# Altium footprint library iuh-thuc-hanh.PcbLib: 63 footprints (part 4 of 4)
Each footprint in its own frame and in the unit in brackets; x right, y up, seen from the top. Pads: shape width x height; smd on the part's side, far side on the other; paste and mask are expansions set on the pad; w line width, h text height; cw(c..) or ccw(c..) is an arc to the next point about the centre after c.
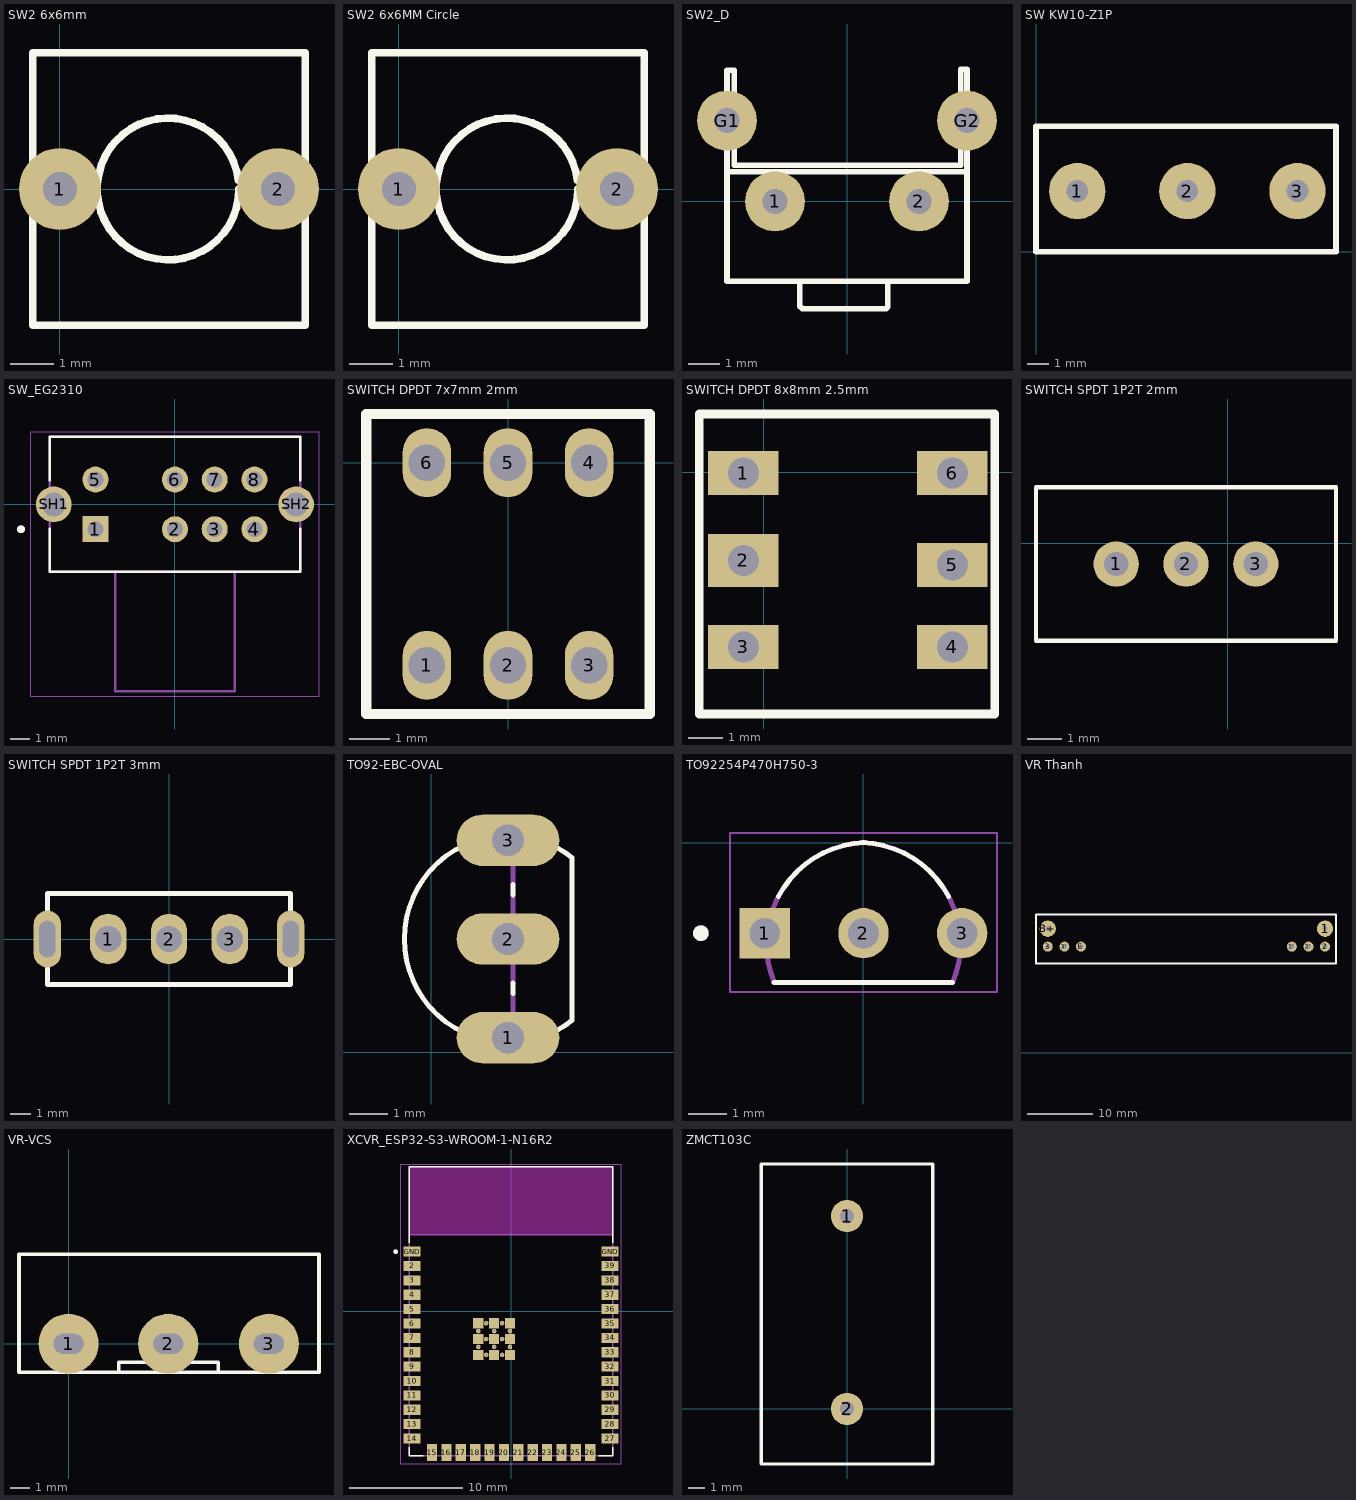
[diagram p3: the footprints below, top view; thin cyan lines are the x and y axes]

## SW2 6x6mm [mil] "SW button 2pin, 250x 250 mil"
height 100
pads (2):
  round 75 hole 31: 1(0,0) 2(200,0)
Top Overlay:
  lines w7: 163.64,8.26 ccw(c99.17,0) 164.17,0 ; -25,-125 -25,125 225,125 225,-125 -25,-125
3D body "82574 tact switch.stp": height 197, standoff -200, extent -22.73,-122.63 222.73,122.63

## SW2 6x6MM Circle [mil] "SW button 2pin, 250x 250 mil 6x6mm"
height 100
pads (2):
  round 75 hole 31: 1(0,0) 2(200,0)
Top Overlay:
  lines w7: 163.64,8.26 ccw(c99.17,0) 164.17,0 ; -25,-125 225,-125 225,125 -25,125 -25,-125
3D body "Push Button Switch 2-Pin.STEP": height 181.1, standoff -78.74, extent -52.32,-122.05 250.83,122.05

## SW2_D [mil] "SW button 2pin, 300x 300 x 250 mil"
height 100
pads (4):
  round 75 hole 31: 1(-90,0) 2(90,0) G1(-150,101) G2(150,101)
Top Overlay:
  lines w7: -150,37 150,37 ; -59,-100 -59,-131 -56,-134 49,-134 51,-132 51,-100 ; -150,-100 -150,164 -141,164 -141,45 142,45 142,165 150,165 150,-100 -150,-100

## SW KW10-Z1P [mm]
pads (3):
  round 2.6 hole 1: 1(1.905,2.794) 2(6.985,2.794) 3(12.065,2.794)
Top Overlay:
  lines w0.254: 0,0 0,5.779 13.843,5.779 13.843,0 0,0
3D body "Micro limit switch.STEP": height 11.31, standoff -1.55, extent 0.657,-0.202 14.605,7.948

## SW_EG2310 [mm]
height 4.7
pads (10):
  rect 1.308x1.308 / inner round 1.308 / far side rect 1.308x1.308 hole 0.8: 1(-4,-1.25)
  round 1.308 hole 0.8: 2(0,-1.25) 3(2,-1.25) 4(4,-1.25) 5(-4,1.25) 6(0,1.25) 7(2,1.25) 8(4,1.25)
  round 1.8 hole 1.2: SH1(-6.1,0) SH2(6.1,0)
Top Overlay:
  circle w0.2: c-7.75,-1.25 r0.1
  lines w0.127: -6.3,-1.22 -6.3,-3.4 6.3,-3.4 6.3,-1.22 ; -6.3,1.22 -6.3,3.4 6.3,3.4 6.3,1.22
Mechanical 13:
  circle w0.2: c-7.75,-1.25 r0.1
  lines w0.127: -3,-3.4 -6.3,-3.4 -6.3,3.4 6.3,3.4 6.3,-3.4 3,-3.4 ; -3,-3.4 3,-3.4 ; -3,-3.4 -3,-9.4 3,-9.4 3,-3.4
Mechanical 15:
  lines w0.05: -7.25,-9.65 -7.25,3.65 7.25,3.65 7.25,-9.65 -7.25,-9.65

## SWITCH DPDT 7x7mm 2mm [mm]
pads (6):
  oval 1.2x1.7 hole 0.9: 1(-2,-5) 2(0,-5) 3(2,-5) 4(2,0) 5(0,0) 6(-2,0)
Top Overlay:
  lines w0.254: -3.5,-6.2 -3.5,1.2 3.5,1.2 3.5,-6.2 -3.5,-6.2
3D body "LatchSwitch_7x7.SLDPRT": height 12.4, standoff -3.65, extent -3.5,-6.04 3.5,0.96

## SWITCH DPDT 8x8mm 2.5mm [mil]
pads (6):
  rect 80x50 hole 35: 1(-23,-1) 3(-23,-198) 4(214,-198) 5(214,-105) 6(214,-1)
  rect 80x60 hole 35: 2(-23,-100)
Top Overlay:
  lines w10: -73,-274 262,-274 262,66 -73,66 -73,-274
3D body "User Library-ZIPPY_P1-1S_8x8_Push_switch_lock.STEP": height 524.22, standoff -145.07, extent -62.48,-265.35 252.48,57.48

## SWITCH SPDT 1P2T 2mm [mm] "TE Connectivity SLS121PC04 SPDT slider"
height 10.058
pads (3):
  round 1.3 hole 0.7: 1(-3.2,-0.6) 2(-1.2,-0.6) 3(0.8,-0.6)
Top Overlay:
  lines w0.127: -5.5,-2.8 -5.5,1.6 3.1,1.6 3.1,-2.8 -5.5,-2.8
3D body "Selector Switch - SS12D00.stp": height 7.05, standoff -2.45, extent -5.563,-2.539 3.023,1.169

## SWITCH SPDT 1P2T 3mm [mm]
pads (5):
  oval 1.8x2.5 hole 1.3: 1(-3,0) 2(0,0) 3(3,0)
  oval 1.35x2.8 hole 0.8 slot 1.8 at 90 deg: ""(-6,0) ""(6,0)
Top Overlay:
  lines w0.254: -6,-2.25 -6,2.25 6,2.25 6,-2.25 -6,-2.25
3D body "Slide Switch SLS121PC04.STEP": height 10.01, standoff -4.32, extent -5.499,-2.794 5.499,2.794

## TO92-EBC-OVAL [mil]
pads (3):
  oval 104x52 hole 32: 1(78,15) 2(78,115) 3(78,215)
Top Overlay:
  lines w5: 33.63,19.84 cw(c78,115) 33.63,210.16 ; 83,59.72 83,70.28 ; 83,159.72 83,170.28 ; 122.37,19.82 ccw(c78,114.98) 142.64,32.24 ; 122.37,210.18 cw(c78,115.02) 142.64,197.76 ; 143,32.52 143,197.48
Mechanical 13:
  lines w5: 33.63,19.84 ccw(c78,115) 122.37,19.84 ; 33.63,210.16 cw(c78,115) 122.37,210.16 ; 83,10.12 83,59.72 ; 83,70.28 83,159.72 ; 83,170.28 83,219.88
3D body "step_temp.STEP": height 210, standoff -750, extent -90.97,-3.97 137.75,224.75

## TO92254P470H750-3 [mm]
height 7.5
pads (3):
  rect 1.298x1.298 / inner round 1.298 / far side rect 1.298x1.298 hole 0.79: 1(-2.54,-2.33)
  round 1.298 hole 0.79: 2(0,-2.33) 3(2.54,-2.33)
Top Overlay:
  circle w0.2: c-4.189,-2.33 r0.1
  lines w0.127: -2.3,-3.6 2.3,-3.6 ; -2.19,-1.381 cw(c0.112,-2.605) 0.021,0.001 ; -0.021,0.001 cw(c-0.112,-2.605) 2.19,-1.381
Mechanical 13:
  circle w0.2: c-4.189,-2.33 r0.1
  lines w0.127: -2.307,-3.582 cw(c0.11,-2.605) 0.019,0.001 ; -2.3,-3.6 2.3,-3.6 ; -0.019,0.001 cw(c-0.11,-2.605) 2.307,-3.582
Mechanical 15:
  lines w0.05: -3.439,-3.85 -3.439,0.252 3.439,0.252 3.439,-3.85 -3.439,-3.85
3D body "step_temp.STEP": height 8.09, standoff -9.01, extent -2.686,-3.81 2.794,-0.21

## VR Thanh [mil]
pads (8):
  round 98.43 hole 30: 1(1880,748.27) B+(210,748.27)
  round 60 hole 30: 1'(1680,640) 2(1880,640) 2'(1780,640) 3(210,640) 3'(310,640) E(410,640)
Top Overlay:
  lines w10: 139,538 1852,538 1946,538 1946,834 139,834 139,538

## VR-VCS [mil] "Volumn control single"
pads (3):
  round 120 hole 40 slot 60 at 0 deg: 1(0,0) 2(199,0) 3(400,0)
Top Overlay:
  lines w7: 100,-57 100,-37 299,-37 299,-57 ; -99,-57 500,-57 500,179 -99,179 -99,-57
3D body "SW3dPS-Pot.STEP": height 839.35, standoff -130, extent -110,-818.11 510,188.11

## XCVR_ESP32-S3-WROOM-1-N16R2 [mm]
height 3.25
pads (61):
  rect 1.5x0.9 smd: 2(-8.75,3.99) 3(-8.75,2.72) 4(-8.75,1.45) 5(-8.75,0.18) 6(-8.75,-1.09) 7(-8.75,-2.36) 8(-8.75,-3.63) 9(-8.75,-4.9) 10(-8.75,-6.17) 11(-8.75,-7.44) 12(-8.75,-8.71) 13(-8.75,-9.98) 14(-8.75,-11.25) 27(8.75,-11.25) 28(8.75,-9.98) 29(8.75,-8.71) 30(8.75,-7.44) 31(8.75,-6.17) 32(8.75,-4.9) 33(8.75,-3.63) 34(8.75,-2.36) 35(8.75,-1.09) 36(8.75,0.18) 37(8.75,1.45) 38(8.75,2.72) 39(8.75,3.99) GND(-8.75,5.26) GND(8.75,5.26)
  rect 0.9x1.5 smd: 15(-6.985,-12.5) 16(-5.715,-12.5) 17(-4.445,-12.5) 18(-3.175,-12.5) 19(-1.905,-12.5) 20(-0.635,-12.5) 21(0.635,-12.5) 22(1.905,-12.5) 23(3.175,-12.5) 24(4.445,-12.5) 25(5.715,-12.5) 26(6.985,-12.5)
  round 0.4 hole 0.2 mask+0: 41_10(-1.5,-1.76) 41_11(-2.9,-1.76) 41_12(-0.1,-1.76) 41_13(-2.9,-3.16) 41_14(-1.5,-3.16) 41_15(-0.1,-3.16) 41_16(-2.2,-1.06) 41_17(-0.8,-1.06) 41_18(-2.2,-2.46) 41_19(-0.8,-2.46) 41_20(-2.2,-3.86) 41_21(-0.8,-3.86)
  rect 0.9x0.9 smd: GND(-2.9,-3.86) GND(-2.9,-2.46) GND(-2.9,-1.06) GND(-1.5,-3.86) GND(-1.5,-2.46) GND(-1.5,-1.06) GND(-0.1,-3.86) GND(-0.1,-2.46) GND(-0.1,-1.06)
Top Overlay:
  circle w0.2: c-10.2,5.26 r0.1
  lines w0.127: -9,-12.02 -9,-12.75 -7.755,-12.75 ; -9,6.03 -9,12.75 9,12.75 9,6.03 ; 7.755,-12.75 9,-12.75 9,-12.02
Keep-Out Layer:
  region: 9,6.75 -9,6.75 -9,12.75 9,12.75
  region: 9,6.75 -9,6.75 -9,12.75 9,12.75
Mechanical 13:
  circle w0.2: c-10.2,5.26 r0.1
  lines w0.127: -9,6.75 -9,-12.75 9,-12.75 9,6.75 ; -9,6.75 -9,12.75 9,12.75 9,6.75 ; -9,6.75 9,6.75
  text "ANTENNA" at -4.5,9.5 h1.27
Mechanical 15:
  lines w0.05: -9.75,-13.5 -9.75,13 9.75,13 9.75,-13.5 -9.75,-13.5
3D body "step_temp.STEP": height 3.25, standoff 0, extent -9,-12.75 9,12.75

## ZMCT103C [mm] "1000:1 - 0~5V"
pads (2):
  round 2 hole 0.9: 1(0,12) 2(0,0)
Top Overlay:
  lines w0.2: -5.334,-3.429 5.334,-3.429 5.334,15.24 -5.334,15.24 -5.334,-3.429
3D body "zmct103c.stp": height 18.2, standoff -4.7, extent -5,-3.031 5,14.969